# Altium footprint library ICs.PcbLib: 179 footprints (part 6 of 12)
Each footprint in its own frame and in the unit in brackets; x right, y up, seen from the top. Pads: shape width x height; smd on the part's side, far side on the other; paste and mask are expansions set on the pad; w line width, h text height; cw(c..) or ccw(c..) is an arc to the next point about the centre after c.
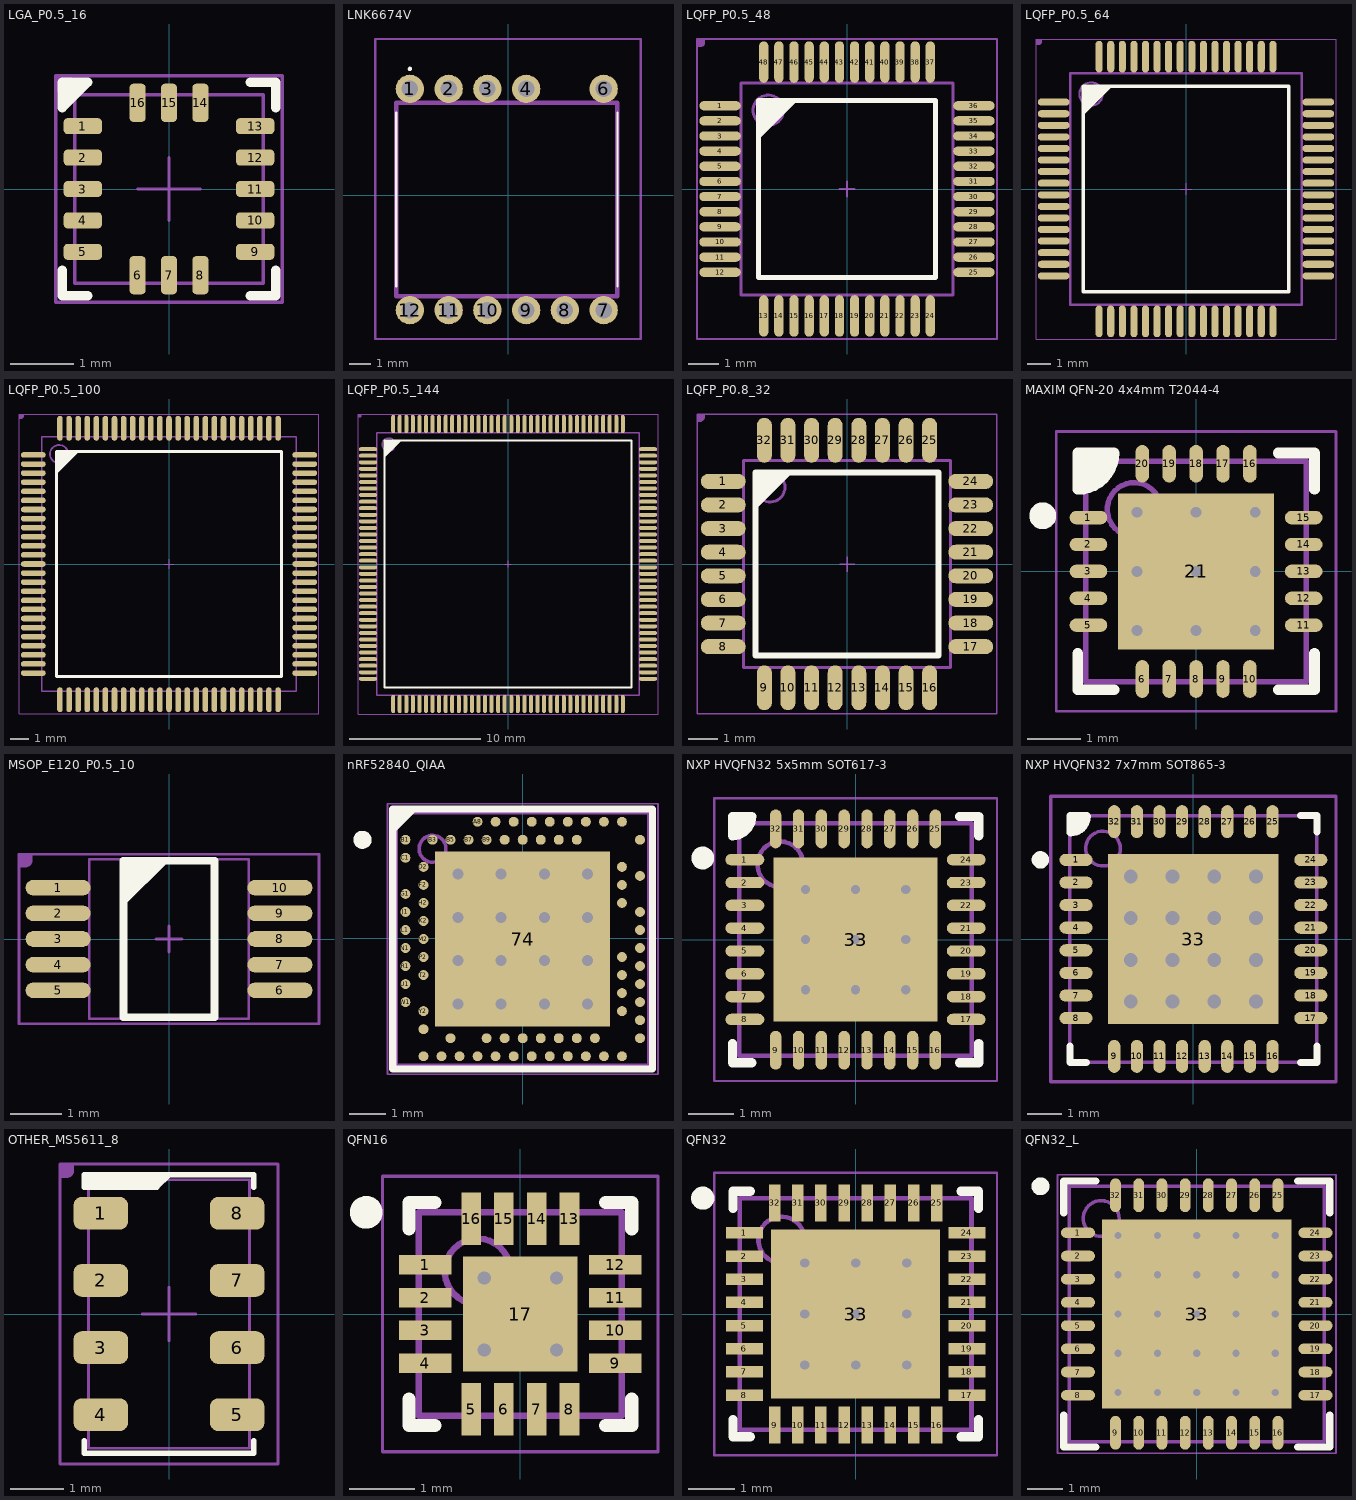
[diagram p5: the footprints below, top view; thin cyan lines are the x and y axes]

## LGA_P0.5_16 [mil]
height 29.53
pads (16):
  rrect50% 24x10 smd: 1(-54,39.37) 2(-54,19.68) 3(-54,0) 4(-54,-19.68) 5(-54,-39.37) 9(54,-39.37) 10(54,-19.68) 11(54,0) 12(54,19.68) 13(54,39.37)
  rrect50% 10x24 smd: 6(-19.68,-54) 7(0,-54) 8(19.68,-54) 14(19.68,54) 15(0,54) 16(-19.68,54)
Top Overlay:
  region: -67,67 -51,67 -67,51
  lines w6: -67,-51 -67,-67 -51,-67 ; 51,-67 67,-67 67,-51 ; 51,67 67,67 67,51 ; -67,51 -67,67 -51,67 -67,51
Top Solder:
  region: 20,-41 -20,-41 -20,-67 20,-67
  region: -41,-40 -41,40 -67,40 -67,-40
  region: 41,40 41,-40 67,-40 67,40
  rectangle: -20,41 20,67
Mechanical 13:
  lines w2: -19.68,0 19.68,0 ; 0,-19.68 0,19.68 ; -59.06,-59.06 59.06,-59.06 59.06,59.06 -59.06,59.06 -59.06,-59.06
Mechanical 14:
  region: -71,71 -61,71 -61,66 -61,65.01 -61.76,63.17 -63.17,61.76 -65.01,61 -66,61 -71,61
  lines w2: -71,-71 71,-71 71,71 -71,71 -71,-71
  text ".Designator" at -41,-25 h100
3D body "PQFN50P300X300X75-16L.step": height 29.53, standoff 0, extent -59.06,-59.06 59.06,59.06

## LNK6674V [mil]
pads (11):
  round 51.29 hole 29.92: 1(-177.39,192) 2(-107.31,192) 3(-37.24,192) 4(32.84,192) 6(173,192) 7(173,-208) 8(102.92,-208) 9(32.84,-208) 10(-37.24,-208) 11(-107.31,-208) 12(-177.39,-208)
Top Overlay:
  lines w3.94: -202.2,-165.48 -202.2,149.48 ; 197.8,-165.48 197.8,149.48 ; -179.36,228.22 cw(c-177.39,228.22) -175.43,228.22 cw(c-177.39,228.22) -179.36,228.22
Mechanical 15:
  lines w7.87: -202.2,-183 197.8,-183 197.8,167 -202.2,167 -202.2,-183
Mechanical 20:
  lines w3.94: -240.2,-260.3 240.2,-260.3 240.2,282.3 -240.2,282.3 -240.2,-260.3

## LQFP_P0.5_48 [mil]
height 62.99
pads (48):
  oval 54x12 smd: 1(-165,108.27) 2(-165,88.58) 3(-165,68.9) 4(-165,49.21) 5(-165,29.53) 6(-165,9.84) 7(-165,-9.84) 8(-165,-29.53) 9(-165,-49.21) 10(-165,-68.9) 11(-165,-88.58) 12(-165,-108.27) 25(165,-108.27) 26(165,-88.58) 27(165,-68.9) 28(165,-49.21) 29(165,-29.53) 30(165,-9.84) 31(165,9.84) 32(165,29.53) 33(165,49.21) 34(165,68.9) 35(165,88.58) 36(165,108.27)
  oval 12x54 smd: 13(-108.27,-165) 14(-88.58,-165) 15(-68.9,-165) 16(-49.21,-165) 17(-29.53,-165) 18(-9.84,-165) 19(9.84,-165) 20(29.53,-165) 21(49.21,-165) 22(68.9,-165) 23(88.58,-165) 24(108.27,-165) 37(108.27,165) 38(88.58,165) 39(68.9,165) 40(49.21,165) 41(29.53,165) 42(9.84,165) 43(-9.84,165) 44(-29.53,165) 45(-49.21,165) 46(-68.9,165) 47(-88.58,165) 48(-108.27,165)
Top Overlay:
  region: -115,115 -65,115 -115,65
  lines w6: -115,-115 -115,115 115,115 115,-115 -115,-115
Mechanical 13:
  circle w3.94: c-102.36,102.36 r19.68
  lines w2: -10,0 10,0 ; 0,-10 0,10
  lines w3.94: -137.8,-137.8 -137.8,137.8 137.8,137.8 137.8,-137.8 -137.8,-137.8
Mechanical 14:
  region: -195,195 -185,195 -185,190 -185,189.01 -185.76,187.17 -187.17,185.76 -189.01,185 -190,185 -195,185
  lines w2: -195,-195 195,-195 195,195 -195,195 -195,-195
  text ".Designator" at -41,-25 h100
3D body "SW3dPS-Quad50M48.STEP": height 61.42, standoff 0, extent -177.16,-177.66 177.17,176.67

## LQFP_P0.5_64 [mil]
height 47.24
pads (64):
  oval 54x12 smd: 1(-225,147.64) 2(-225,127.95) 3(-225,108.27) 4(-225,88.58) 5(-225,68.9) 6(-225,49.21) 7(-225,29.53) 8(-225,9.84) 9(-225,-9.84) 10(-225,-29.53) 11(-225,-49.21) 12(-225,-68.9) 13(-225,-88.58) 14(-225,-108.27) 15(-225,-127.95) 16(-225,-147.64) 33(225,-147.64) 34(225,-127.95) 35(225,-108.27) 36(225,-88.58) 37(225,-68.9) 38(225,-49.21) 39(225,-29.53) 40(225,-9.84) 41(225,9.84) 42(225,29.53) 43(225,49.21) 44(225,68.9) 45(225,88.58) 46(225,108.27) 47(225,127.95) 48(225,147.64)
  oval 12x54 smd: 17(-147.64,-225) 18(-127.95,-225) 19(-108.27,-225) 20(-88.58,-225) 21(-68.9,-225) 22(-49.21,-225) 23(-29.53,-225) 24(-9.84,-225) 25(9.84,-225) 26(29.53,-225) 27(49.21,-225) 28(68.9,-225) 29(88.58,-225) 30(108.27,-225) 31(127.95,-225) 32(147.64,-225) 49(147.64,225) 50(127.95,225) 51(108.27,225) 52(88.58,225) 53(68.9,225) 54(49.21,225) 55(29.53,225) 56(9.84,225) 57(-9.84,225) 58(-29.53,225) 59(-49.21,225) 60(-68.9,225) 61(-88.58,225) 62(-108.27,225) 63(-127.95,225) 64(-147.64,225)
Top Overlay:
  region: -175,175 -125,175 -175,125
  lines w6: -175,-175 175,-175 175,175 -175,175 -175,-175
Mechanical 13:
  circle w3.94: c-161.42,161.42 r19.68
  lines w2: -10,0 10,0 ; 0,-10 0,10
  lines w3.94: -196.85,-196.85 -196.85,196.85 196.85,196.85 196.85,-196.85 -196.85,-196.85
Mechanical 14:
  region: -255,255 -245,255 -245,250 -245,249.01 -245.76,247.17 -247.17,245.76 -249.01,245 -250,245 -255,245
  lines w2: -255,-255 -255,255 255,255 255,-255 -255,-255
  text ".Designator" at -41,-25 h100
3D body "User Library-lqpf64.STEP": height 59.06, standoff 0.79, extent -236.21,-236.22 236.23,236.22

## LQFP_P0.5_100 [mil]
height 62.99
pads (100):
  oval 54x12 smd: 1(-294,236.22) 2(-294,216.54) 3(-294,196.85) 4(-294,177.17) 5(-294,157.48) 6(-294,137.8) 7(-294,118.11) 8(-294,98.43) 9(-294,78.74) 10(-294,59.06) 11(-294,39.37) 12(-294,19.68) 13(-294,0) 14(-294,-19.69) 15(-294,-39.37) 16(-294,-59.06) 17(-294,-78.74) 18(-294,-98.43) 19(-294,-118.11) 20(-294,-137.8) 21(-294,-157.48) 22(-294,-177.17) 23(-294,-196.85) 24(-294,-216.54) 25(-294,-236.22) 51(294,-236.22) 52(294,-216.54) 53(294,-196.85) 54(294,-177.17) 55(294,-157.48) 56(294,-137.8) 57(294,-118.11) 58(294,-98.43) 59(294,-78.74) 60(294,-59.06) 61(294,-39.37) 62(294,-19.69) 63(294,0) 64(294,19.68) 65(294,39.37) 66(294,59.06) 67(294,78.74) 68(294,98.43) 69(294,118.11) 70(294,137.8) 71(294,157.48) 72(294,177.17) 73(294,196.85) 74(294,216.54) 75(294,236.22)
  oval 12x54 smd: 26(-236.22,-294) 27(-216.54,-294) 28(-196.85,-294) 29(-177.17,-294) 30(-157.48,-294) 31(-137.8,-294) 32(-118.11,-294) 33(-98.43,-294) 34(-78.74,-294) 35(-59.06,-294) 36(-39.37,-294) 37(-19.68,-294) 38(0,-294) 39(19.69,-294) 40(39.37,-294) 41(59.06,-294) 42(78.74,-294) 43(98.43,-294) 44(118.11,-294) 45(137.8,-294) 46(157.48,-294) 47(177.17,-294) 48(196.85,-294) 49(216.54,-294) 50(236.22,-294) 76(236.22,294) 77(216.54,294) 78(196.85,294) 79(177.17,294) 80(157.48,294) 81(137.8,294) 82(118.11,294) 83(98.43,294) 84(78.74,294) 85(59.06,294) 86(39.37,294) 87(19.69,294) 88(0,294) 89(-19.68,294) 90(-39.37,294) 91(-59.06,294) 92(-78.74,294) 93(-98.43,294) 94(-118.11,294) 95(-137.8,294) 96(-157.48,294) 97(-177.17,294) 98(-196.85,294) 99(-216.54,294) 100(-236.22,294)
Top Overlay:
  region: -244,244 -194,244 -244,194
  lines w6: -244,-244 244,-244 244,244 -244,244 -244,-244
Mechanical 13:
  circle w3.94: c-238.19,238.19 r19.68
  lines w2: -10,0 10,0 ; 0,-10 0,10
  lines w3.94: -275.59,-275.59 -275.59,275.59 275.59,275.59 275.59,-275.59 -275.59,-275.59
Mechanical 14:
  region: -325,325 -315,325 -315,320 -315,319.01 -315.76,317.17 -317.17,315.76 -319.01,315 -320,315 -325,315
  lines w2: -325,-325 325,-325 325,325 -325,325 -325,-325
  text ".Designator" at -41,-25 h100
3D body "User Library-LQFP100-0_5.STEP": height 61.5, standoff -0.39, extent -310.47,-310.47 310.49,310.48

## LQFP_P0.5_144 [mil]
height 62.99
pads (144):
  oval 54x12 smd: 1(-420,344.49) 2(-420,324.8) 3(-420,305.12) 4(-420,285.43) 5(-420,265.75) 6(-420,246.06) 7(-420,226.38) 8(-420,206.69) 9(-420,187.01) 10(-420,167.32) 11(-420,147.64) 12(-420,127.95) 13(-420,108.27) 14(-420,88.58) 15(-420,68.9) 16(-420,49.21) 17(-420,29.53) 18(-420,9.84) 19(-420,-9.84) 20(-420,-29.53) 21(-420,-49.21) 22(-420,-68.9) 23(-420,-88.58) 24(-420,-108.27) 25(-420,-127.95) 26(-420,-147.64) 27(-420,-167.32) 28(-420,-187.01) 29(-420,-206.69) 30(-420,-226.38) 31(-420,-246.06) 32(-420,-265.75) 33(-420,-285.43) 34(-420,-305.12) 35(-420,-324.8) 36(-420,-344.49) 73(420,-344.49) 74(420,-324.8) 75(420,-305.12) 76(420,-285.43) 77(420,-265.75) 78(420,-246.06) 79(420,-226.38) 80(420,-206.69) 81(420,-187.01) 82(420,-167.32) 83(420,-147.64) 84(420,-127.95) 85(420,-108.27) 86(420,-88.58) 87(420,-68.9) 88(420,-49.21) 89(420,-29.53) 90(420,-9.84) 91(420,9.84) 92(420,29.53) 93(420,49.21) 94(420,68.9) 95(420,88.58) 96(420,108.27) 97(420,127.95) 98(420,147.64) 99(420,167.32) 100(420,187.01) 101(420,206.69) 102(420,226.38) 103(420,246.06) 104(420,265.75) 105(420,285.43) 106(420,305.12) 107(420,324.8) 108(420,344.49)
  oval 12x54 smd: 37(-344.49,-420) 38(-324.8,-420) 39(-305.12,-420) 40(-285.43,-420) 41(-265.75,-420) 42(-246.06,-420) 43(-226.38,-420) 44(-206.69,-420) 45(-187.01,-420) 46(-167.32,-420) 47(-147.64,-420) 48(-127.95,-420) 49(-108.27,-420) 50(-88.58,-420) 51(-68.9,-420) 52(-49.21,-420) 53(-29.53,-420) 54(-9.84,-420) 55(9.84,-420) 56(29.53,-420) 57(49.21,-420) 58(68.9,-420) 59(88.58,-420) 60(108.27,-420) 61(127.95,-420) 62(147.64,-420) 63(167.32,-420) 64(187.01,-420) 65(206.69,-420) 66(226.38,-420) 67(246.06,-420) 68(265.75,-420) 69(285.43,-420) 70(305.12,-420) 71(324.8,-420) 72(344.49,-420) 109(344.49,420) 110(324.8,420) 111(305.12,420) 112(285.43,420) 113(265.75,420) 114(246.06,420) 115(226.38,420) 116(206.69,420) 117(187.01,420) 118(167.32,420) 119(147.64,420) 120(127.95,420) 121(108.27,420) 122(88.58,420) 123(68.9,420) 124(49.21,420) 125(29.53,420) 126(9.84,420) 127(-9.84,420) 128(-29.53,420) 129(-49.21,420) 130(-68.9,420) 131(-88.58,420) 132(-108.27,420) 133(-127.95,420) 134(-147.64,420) 135(-167.32,420) 136(-187.01,420) 137(-206.69,420) 138(-226.38,420) 139(-246.06,420) 140(-265.75,420) 141(-285.43,420) 142(-305.12,420) 143(-324.8,420) 144(-344.49,420)
Top Overlay:
  region: -370,370 -320,370 -370,320
  lines w6: -370,-370 370,-370 370,370 -370,370 -370,-370
Mechanical 13:
  circle w4: c-358.27,358.27 r19.68
  lines w2: -10,0 10,0 ; 0,-10 0,10
  lines w4: -393.7,-393.7 393.7,-393.7 393.7,393.7 -393.7,393.7 -393.7,-393.7
Mechanical 14:
  region: -450,450 -440,450 -440,445 -440,444.01 -440.76,442.17 -442.17,440.76 -444.01,440 -445,440 -450,440
  lines w2: -450,-450 -450,450 450,450 450,-450 -450,-450
  text ".Designator" at -41,-25 h100
3D body "User Library-LQFP144.STEP": height 62.99, standoff 0, extent -433.07,-433.07 433.08,433.08

## LQFP_P0.8_32 [mil]
height 47.24
pads (32):
  oval 60x20 smd: 1(-165,110.24) 2(-165,78.74) 3(-165,47.24) 4(-165,15.75) 5(-165,-15.75) 6(-165,-47.24) 7(-165,-78.74) 8(-165,-110.24) 17(165,-110.24) 18(165,-78.74) 19(165,-47.24) 20(165,-15.75) 21(165,15.75) 22(165,47.24) 23(165,78.74) 24(165,110.24)
  oval 20x60 smd: 9(-110.24,-165) 10(-78.74,-165) 11(-47.24,-165) 12(-15.75,-165) 13(15.75,-165) 14(47.24,-165) 15(78.74,-165) 16(110.24,-165) 25(110.24,165) 26(78.74,165) 27(47.24,165) 28(15.75,165) 29(-15.75,165) 30(-47.24,165) 31(-78.74,165) 32(-110.24,165)
Top Overlay:
  region: -122.05,122.05 -72.05,122.05 -122.05,72.05
  lines w7.87: -122.05,-122.05 -122.05,122.05 122.05,122.05 122.05,-122.05 -122.05,-122.05
Mechanical 13:
  circle w3.94: c-102.36,102.36 r19.68
  lines w2: -10,0 10,0 ; 0,-10 0,10
  lines w3.94: -137.8,-137.8 -137.8,137.8 137.8,137.8 137.8,-137.8 -137.8,-137.8
Mechanical 14:
  region: -200,200 -190,200 -190,195 -190,194.01 -190.76,192.17 -192.17,190.76 -194.01,190 -195,190 -200,190
  lines w2: -200,-200 200,-200 200,200 -200,200 -200,-200
  text ".Designator" at -41,-25 h100
3D body "User Library-LQFP32-0_8.STEP": height 63.46, standoff -2.02, extent -177.92,-177.92 177.93,177.93

## MAXIM QFN-20 4x4mm T2044-4 [mm] "TQFN, 20-Leads, Body 4.00x4.00mm, Pitch 0.50mm, Thermal Pad 2.90x2.90mm, IPC Medium Density"
height 0.8
pads (21):
  oval 0.7x0.25 smd: 1(-2,1) 2(-2,0.5) 3(-2,0) 4(-2,-0.5) 5(-2,-1) 11(2,-1) 12(2,-0.5) 13(2,0) 14(2,0.5) 15(2,1)
  oval 0.25x0.7 smd: 6(-1,-2) 7(-0.5,-2) 8(0,-2) 9(0.5,-2) 10(1,-2) 16(1,2) 17(0.5,2) 18(0,2) 19(-0.5,2) 20(-1,2)
  rect 2.9x2.9 smd: 21(0,0)
via 1.1,-1.1 diameter 0.5 hole 0.2
via 0,-1.1 diameter 0.5 hole 0.2
via -1.1,-1.1 diameter 0.5 hole 0.2
via 1.1,0 diameter 0.5 hole 0.2
via 0,0 diameter 0.5 hole 0.2
via -1.1,0 diameter 0.5 hole 0.2
via 1.1,1.1 diameter 0.5 hole 0.2
via 0,1.1 diameter 0.5 hole 0.2
via -1.1,1.1 diameter 0.5 hole 0.2
Top Overlay:
  circle w0.25: c-2.85,1.034 r0.125
  region: -2.159,2.2 -1.525,2.2 -1.525,1.904 -1.904,1.525 -2.2,1.525
  lines w0.2: -2.2,-1.525 -2.2,-2.2 -1.525,-2.2 ; 1.525,-2.2 2.2,-2.2 2.2,-1.525 ; 1.525,2.2 2.2,2.2 2.2,1.525 ; -2.2,1.525 ccw(c-2.2,2.2) -1.525,2.2 -2.2,2.2 -2.2,1.525
Mechanical 13:
  circle w0.1: c-1.15,1.15 r0.5
  lines w0.1: -2.05,-2.05 2.05,-2.05 2.05,2.05 -2.05,2.05 -2.05,-2.05
Mechanical 15:
  lines w0.05: -2.6,-2.6 2.6,-2.6 2.6,2.6 -2.6,2.6 -2.6,-2.6
  lines w0.1: -0.5,0 0.5,0 ; 0,-0.5 0,0.5
3D body: height 0.8, standoff 0.01, extent -2.05,-2.05 2.05,2.05

## MSOP_E120_P0.5_10 [mil]
height 43.31
pads (10):
  oval 50x12 smd: 1(-85,39.37) 2(-85,19.69) 3(-85,0) 4(-85,-19.68) 5(-85,-39.37) 6(85,-39.37) 7(85,-19.68) 8(85,0) 9(85,19.69) 10(85,39.37)
Top Overlay:
  region: -35,60 0,60 -35,25
  lines w6: -35,-60 -35,60 35,60 35,-60 -35,-60
Mechanical 13:
  lines w2: -10,0 10,0 ; 0,-10 0,10 ; -61.02,-61.02 61.02,-61.02 61.02,61.02 -61.02,61.02 -61.02,-61.02
Mechanical 14:
  region: -115,65 -105,65 -105,60 -105,59.01 -105.76,57.17 -107.17,55.76 -109.01,55 -110,55 -115,55
  lines w2: -115,-65 115,-65 115,65 -115,65 -115,-65
  text ".Designator" at -41,-25 h100
3D body "User Library-msop-10.STEP": height 45.28, standoff 0, extent -96.45,-59.05 96.46,59.06

## nRF52840_QIAA [mm]
pads (74):
  rect 4.85x4.85 smd mask+0.05: 74(-0.007,-0.024)
  round 0.275 smd paste+0.012 mask+0.05: A8(-1.257,3.226) A10(-0.757,3.226) A12(-0.257,3.226) A14(0.243,3.226) A16(0.743,3.226) A18(1.243,3.226) A20(1.743,3.226) A22(2.243,3.226) A23(2.743,3.226) AA24(3.243,-2.274) AB2(-2.757,-2.524) AC5(-2.007,-2.774) AC9(-1.007,-2.774) AC11(-0.507,-2.774) AC13(-0.007,-2.774) AC15(0.493,-2.774) AC17(0.993,-2.774) AC19(1.493,-2.774) AC21(1.993,-2.774) AC24(3.243,-2.774) AD2(-2.757,-3.274) AD4(-2.257,-3.274) AD6(-1.757,-3.274) AD8(-1.257,-3.274) AD10(-0.757,-3.274) AD12(-0.257,-3.274) AD14(0.243,-3.274) AD16(0.743,-3.274) AD18(1.243,-3.274) AD20(1.743,-3.274) AD22(2.243,-3.274) AD23(2.743,-3.274) B1(-3.257,2.726) B3(-2.507,2.726) B5(-2.007,2.726) B7(-1.507,2.726) B9(-1.007,2.726) B11(-0.507,2.726) B13(-0.007,2.726) B15(0.493,2.726) B17(0.993,2.726) B19(1.493,2.726) B24(3.243,2.726) C1(-3.257,2.226) D2(-2.757,1.976) D23(2.743,1.976) E24(3.243,1.726) F2(-2.757,1.476) F23(2.743,1.476) G1(-3.257,1.226) H2(-2.757,0.976) H23(2.743,0.976) J1(-3.257,0.726) J24(3.243,0.726) K2(-2.757,0.476) L1(-3.257,0.226) L24(3.243,0.226) M2(-2.757,-0.024) N1(-3.257,-0.274) N24(3.243,-0.274) P2(-2.757,-0.524) P23(2.743,-0.524) R1(-3.257,-0.774) R24(3.243,-0.774) T2(-2.757,-1.024) T23(2.743,-1.024) U1(-3.257,-1.274) U24(3.243,-1.274) V23(2.743,-1.524) W1(-3.257,-1.774) W24(3.243,-1.774) Y2(-2.757,-2.024) Y23(2.743,-2.024)
via 1.793,-1.824 diameter 0.61 hole 0.305
via 0.593,-1.824 diameter 0.61 hole 0.305
via -0.607,-1.824 diameter 0.61 hole 0.305
via -1.807,-1.824 diameter 0.61 hole 0.305
via 1.793,-0.624 diameter 0.61 hole 0.305
via 0.593,-0.624 diameter 0.61 hole 0.305
via -0.607,-0.624 diameter 0.61 hole 0.305
via -1.807,-0.624 diameter 0.61 hole 0.305
via 1.793,0.576 diameter 0.61 hole 0.305
via 0.593,0.576 diameter 0.61 hole 0.305
via -0.607,0.576 diameter 0.61 hole 0.305
via -1.807,0.576 diameter 0.61 hole 0.305
via 1.793,1.776 diameter 0.61 hole 0.305
via 0.593,1.776 diameter 0.61 hole 0.305
via -0.607,1.776 diameter 0.61 hole 0.305
via -1.807,1.776 diameter 0.61 hole 0.305
Top Overlay:
  circle w0.25: c-4.447,2.726 r0.125
  region: -3.007,3.476 -3.507,2.976 -3.507,3.476
  lines w0.2: -3.607,-3.624 3.593,-3.624 3.593,3.576 -3.607,3.576 -3.607,-3.624
Mechanical 7:
  circle w0.1: c-2.507,2.476 r0.373
  lines w0.1: -3.507,-3.524 -3.507,3.476 3.493,3.476 3.493,-3.524 -3.507,-3.524
  text ".Designator" at -0.185,-0.177 h0.3
Mechanical 15:
  lines w0.05: -3.757,-3.774 3.743,-3.774 3.743,3.726 -3.757,3.726 -3.757,-3.774
  lines w0.1: -0.507,-0.024 0.493,-0.024 ; -0.007,-0.524 -0.007,0.476
3D body "LGA88C25P25X25_700X700X85.step": height 0.85, standoff 0, extent -3.557,-3.574 3.543,3.526

## NXP HVQFN32 5x5mm SOT617-3 [mm] "HVQFN, 32-Leads, Body 5.00x5.00mm, Pitch 0.50mm, Thermal Pad 3.60x3.60mm, IPC Medium Density"
height 0.85
pads (33):
  oval 0.85x0.25 smd: 1(-2.425,1.75) 2(-2.425,1.25) 3(-2.425,0.75) 4(-2.425,0.25) 5(-2.425,-0.25) 6(-2.425,-0.75) 7(-2.425,-1.25) 8(-2.425,-1.75) 17(2.425,-1.75) 18(2.425,-1.25) 19(2.425,-0.75) 20(2.425,-0.25) 21(2.425,0.25) 22(2.425,0.75) 23(2.425,1.25) 24(2.425,1.75)
  oval 0.25x0.85 smd: 9(-1.75,-2.425) 10(-1.25,-2.425) 11(-0.75,-2.425) 12(-0.25,-2.425) 13(0.25,-2.425) 14(0.75,-2.425) 15(1.25,-2.425) 16(1.75,-2.425) 25(1.75,2.425) 26(1.25,2.425) 27(0.75,2.425) 28(0.25,2.425) 29(-0.25,2.425) 30(-0.75,2.425) 31(-1.25,2.425) 32(-1.75,2.425)
  rect 3.6x3.6 smd: 33(0,0)
via 1.1,-1.1 diameter 0.5 hole 0.2
via 0,-1.1 diameter 0.5 hole 0.2
via -1.1,-1.1 diameter 0.5 hole 0.2
via 1.1,0 diameter 0.5 hole 0.2
via 0,0 diameter 0.5 hole 0.2
via -1.1,0 diameter 0.5 hole 0.2
via 1.1,1.1 diameter 0.5 hole 0.2
via 0,1.1 diameter 0.5 hole 0.2
via -1.1,1.1 diameter 0.5 hole 0.2
Top Overlay:
  circle w0.25: c-3.35,1.788 r0.125
  region: -2.7,2.7 -2.275,2.7 -2.275,2.551 -2.551,2.275 -2.7,2.275
  lines w0.2: -2.7,-2.275 -2.7,-2.7 -2.275,-2.7 ; 2.275,-2.7 2.7,-2.7 2.7,-2.275 ; 2.275,2.7 2.7,2.7 2.7,2.275 ; -2.7,2.275 ccw(c-2.7,2.7) -2.275,2.7 -2.7,2.7 -2.7,2.275
Mechanical 13:
  circle w0.1: c-1.65,1.65 r0.5
  lines w0.1: -2.55,-2.55 2.55,-2.55 2.55,2.55 -2.55,2.55 -2.55,-2.55
Mechanical 15:
  lines w0.05: -3.1,-3.1 3.1,-3.1 3.1,3.1 -3.1,3.1 -3.1,-3.1
  lines w0.1: -0.5,0 0.5,0 ; 0,-0.5 0,0.5
3D body: height 0.85, standoff 0, extent -2.55,-2.55 2.55,2.55

## NXP HVQFN32 7x7mm SOT865-3 [mm] "QFN, 32-Leads, Body 7.1x7.1mm (max), Pitch 0.65mm, IPC Medium Density"
height 1
pads (33):
  oval 0.95x0.35 smd: 1(-3.375,2.275) 2(-3.375,1.625) 3(-3.375,0.975) 4(-3.375,0.325) 5(-3.375,-0.325) 6(-3.375,-0.975) 7(-3.375,-1.625) 8(-3.375,-2.275) 17(3.375,-2.275) 18(3.375,-1.625) 19(3.375,-0.975) 20(3.375,-0.325) 21(3.375,0.325) 22(3.375,0.975) 23(3.375,1.625) 24(3.375,2.275)
  oval 0.35x0.95 smd: 9(-2.275,-3.375) 10(-1.625,-3.375) 11(-0.975,-3.375) 12(-0.325,-3.375) 13(0.325,-3.375) 14(0.975,-3.375) 15(1.625,-3.375) 16(2.275,-3.375) 25(2.275,3.375) 26(1.625,3.375) 27(0.975,3.375) 28(0.325,3.375) 29(-0.325,3.375) 30(-0.975,3.375) 31(-1.625,3.375) 32(-2.275,3.375)
  rect 4.9x4.9 smd: 33(0,0)
via 1.8,-1.8 diameter 0.8 hole 0.4
via 0.6,-1.8 diameter 0.8 hole 0.4
via -0.6,-1.8 diameter 0.8 hole 0.4
via -1.8,-1.8 diameter 0.8 hole 0.4
via 1.8,-0.6 diameter 0.8 hole 0.4
via 0.6,-0.6 diameter 0.8 hole 0.4
via -0.6,-0.6 diameter 0.8 hole 0.4
via -1.8,-0.6 diameter 0.8 hole 0.4
via 1.8,0.6 diameter 0.8 hole 0.4
via 0.6,0.6 diameter 0.8 hole 0.4
via -0.6,0.6 diameter 0.8 hole 0.4
via -1.8,0.6 diameter 0.8 hole 0.4
via 1.8,1.8 diameter 0.8 hole 0.4
via 0.6,1.8 diameter 0.8 hole 0.4
via -0.6,1.8 diameter 0.8 hole 0.4
via -1.8,1.8 diameter 0.8 hole 0.4
Top Overlay:
  circle w0.25: c-4.4,2.275 r0.125
  rectangle: -3.302,3.175 -3.175,3.302
  rectangle: -3.302,3.302 -3.048,3.55
  rectangle: -3.55,3.048 -3.302,3.55
  lines w0.2: -3.55,-3.075 -3.55,-3.55 -3.075,-3.55 ; 3.075,-3.55 3.55,-3.55 3.55,-3.075 ; 3.075,3.55 3.55,3.55 3.55,3.075 ; -3.55,3.075 ccw(c-3.525,3.075) -3.525,3.05 ccw(c-3.525,3.525) -3.05,3.525 ccw(c-3.075,3.525) -3.075,3.55 -3.55,3.55 -3.55,3.075
Mechanical 13:
  circle w0.1: c-2.6,2.6 r0.5
  lines w0.1: -3.55,-3.55 3.55,-3.55 3.55,3.55 -3.55,3.55 -3.55,-3.55
Mechanical 15:
  lines w0.1: -0.5,0 0.5,0 ; 0,-0.5 0,0.5 ; -4.1,-4.1 4.1,-4.1 4.1,4.1 -4.1,4.1 -4.1,-4.1
3D body: height 1, standoff 0, extent -3.55,-3.55 3.55,3.55

## OTHER_MS5611_8 [mil]
height 39.37
pads (8):
  rrect50% 40x24 smd: 1(-50,73.82) 2(-50,24.61) 3(-50,-24.61) 4(-50,-73.82) 5(50,-73.82) 6(50,-24.61) 7(50,24.61) 8(50,73.82)
Top Overlay:
  region: -62,102 0,102 -9,93 -62,93
  lines w4: -62,-93 -62,-102 62,-102 62,-93 ; 0,102 -9,93 -62,93 -62,102 62,102 62,93
Mechanical 13:
  lines w2: -19.68,0 19.68,0 ; 0,-19.68 0,19.68 ; -59.06,-98.43 -59.06,98.43 59.06,98.43 59.06,-98.43 -59.06,-98.43
Mechanical 14:
  region: -80,110 -70,110 -70,105 -70,104.01 -70.76,102.17 -72.17,100.76 -74.01,100 -75,100 -80,100
  lines w2: -80,-110 80,-110 80,110 -80,110 -80,-110
  text ".Designator" at -41,-25 h100
3D body "User Library-CRYSTALSMD5X32.STEP": height 39.37, standoff 0, extent -62.99,-98.43 63,98.43

## QFN16 [mm]
height 0.75
pads (17):
  rect 0.8x0.3 smd: 1(-1.45,0.75) 2(-1.45,0.25) 3(-1.45,-0.25) 4(-1.45,-0.75) 9(1.45,-0.75) 10(1.45,-0.25) 11(1.45,0.25) 12(1.45,0.75)
  rect 0.3x0.8 smd: 5(-0.75,-1.45) 6(-0.25,-1.45) 7(0.25,-1.45) 8(0.75,-1.45) 13(0.75,1.45) 14(0.25,1.45) 15(-0.25,1.45) 16(-0.75,1.45)
  rect 1.75x1.75 smd: 17(0,0)
via 0.55,-0.55 diameter 0.5 hole 0.2
via -0.55,-0.55 diameter 0.5 hole 0.2
via 0.55,0.55 diameter 0.5 hole 0.2
via -0.55,0.55 diameter 0.5 hole 0.2
Top Overlay:
  circle w0.25: c-2.35,1.55 r0.125
  lines w0.2: -1.7,-1.3 -1.7,-1.7 -1.3,-1.7 ; -1.7,1.3 -1.7,1.7 -1.3,1.7 ; 1.3,-1.7 1.7,-1.7 1.7,-1.3 ; 1.3,1.7 1.7,1.7 1.7,1.3
Mechanical 13:
  circle w0.1: c-0.65,0.65 r0.5
  lines w0.1: -1.55,-1.55 1.55,-1.55 1.55,1.55 -1.55,1.55 -1.55,-1.55
Mechanical 15:
  lines w0.05: -2.1,-2.1 2.1,-2.1 2.1,2.1 -2.1,2.1 -2.1,-2.1
  lines w0.1: -0.5,0 0.5,0 ; 0,-0.5 0,0.5
3D body "QFN16.step": height 0.75, standoff 0, extent -1.56,-1.56 1.56,1.56

## QFN32 [mm]
height 0.75
pads (33):
  rect 0.8x0.25 smd: 1(-2.4,1.75) 2(-2.4,1.25) 3(-2.4,0.75) 4(-2.4,0.25) 5(-2.4,-0.25) 6(-2.4,-0.75) 7(-2.4,-1.25) 8(-2.4,-1.75) 17(2.4,-1.75) 18(2.4,-1.25) 19(2.4,-0.75) 20(2.4,-0.25) 21(2.4,0.25) 22(2.4,0.75) 23(2.4,1.25) 24(2.4,1.75)
  rect 0.25x0.8 smd: 9(-1.75,-2.4) 10(-1.25,-2.4) 11(-0.75,-2.4) 12(-0.25,-2.4) 13(0.25,-2.4) 14(0.75,-2.4) 15(1.25,-2.4) 16(1.75,-2.4) 25(1.75,2.4) 26(1.25,2.4) 27(0.75,2.4) 28(0.25,2.4) 29(-0.25,2.4) 30(-0.75,2.4) 31(-1.25,2.4) 32(-1.75,2.4)
  rect 3.65x3.65 smd: 33(0,0)
via -1.1,1.1 diameter 0.5 hole 0.2
via 0,1.1 diameter 0.5 hole 0.2
via 1.1,1.1 diameter 0.5 hole 0.2
via -1.1,0 diameter 0.5 hole 0.2
via 0,0 diameter 0.5 hole 0.2
via 1.1,0 diameter 0.5 hole 0.2
via -1.1,-1.1 diameter 0.5 hole 0.2
via 0,-1.1 diameter 0.5 hole 0.2
via 1.1,-1.1 diameter 0.5 hole 0.2
Top Overlay:
  circle w0.25: c-3.3,2.5 r0.125
  lines w0.2: -2.65,-2.275 -2.65,-2.65 -2.275,-2.65 ; -2.65,2.275 -2.65,2.65 -2.275,2.65 ; 2.275,-2.65 2.65,-2.65 2.65,-2.275 ; 2.275,2.65 2.65,2.65 2.65,2.275
Mechanical 13:
  circle w0.1: c-1.6,1.6 r0.5
  lines w0.1: -2.5,-2.5 -2.5,2.5 2.5,2.5 2.5,-2.5 -2.5,-2.5
Mechanical 15:
  lines w0.05: -3.05,-3.05 -3.05,3.05 3.05,3.05 3.05,-3.05 -3.05,-3.05
  lines w0.1: -0.5,0 0.5,0 ; 0,-0.5 0,0.5
3D body "QFN32.step": height 0.75, standoff 0, extent -2.51,-2.51 2.51,2.51

## QFN32_L [mm] "QFN, 32-Leads, Body 7x7mm, Pitch 0.65mm, Thermal Pad 5.3x5.3mm, IPC High Density"
height 1
pads (33):
  oval 0.95x0.3 smd: 1(-3.325,2.275) 2(-3.325,1.625) 3(-3.325,0.975) 4(-3.325,0.325) 5(-3.325,-0.325) 6(-3.325,-0.975) 7(-3.325,-1.625) 8(-3.325,-2.275) 17(3.325,-2.275) 18(3.325,-1.625) 19(3.325,-0.975) 20(3.325,-0.325) 21(3.325,0.325) 22(3.325,0.975) 23(3.325,1.625) 24(3.325,2.275)
  oval 0.3x0.95 smd: 9(-2.275,-3.325) 10(-1.625,-3.325) 11(-0.975,-3.325) 12(-0.325,-3.325) 13(0.325,-3.325) 14(0.975,-3.325) 15(1.625,-3.325) 16(2.275,-3.325) 25(2.275,3.325) 26(1.625,3.325) 27(0.975,3.325) 28(0.325,3.325) 29(-0.325,3.325) 30(-0.975,3.325) 31(-1.625,3.325) 32(-2.275,3.325)
  rect 5.3x5.3 smd: 33(0,0)
via -2.2,2.2 diameter 0.5 hole 0.2
via -1.1,2.2 diameter 0.5 hole 0.2
via 0,2.2 diameter 0.5 hole 0.2
via 1.1,2.2 diameter 0.5 hole 0.2
via 2.2,2.2 diameter 0.5 hole 0.2
via -2.2,1.1 diameter 0.5 hole 0.2
via -1.1,1.1 diameter 0.5 hole 0.2
via 0,1.1 diameter 0.5 hole 0.2
via 1.1,1.1 diameter 0.5 hole 0.2
via 2.2,1.1 diameter 0.5 hole 0.2
via -2.2,0 diameter 0.5 hole 0.2
via -1.1,0 diameter 0.5 hole 0.2
via 0,0 diameter 0.5 hole 0.2
via 1.1,0 diameter 0.5 hole 0.2
via 2.2,0 diameter 0.5 hole 0.2
via -2.2,-1.1 diameter 0.5 hole 0.2
via -1.1,-1.1 diameter 0.5 hole 0.2
via 0,-1.1 diameter 0.5 hole 0.2
via 1.1,-1.1 diameter 0.5 hole 0.2
via 2.2,-1.1 diameter 0.5 hole 0.2
via -2.2,-2.2 diameter 0.5 hole 0.2
via -1.1,-2.2 diameter 0.5 hole 0.2
via 0,-2.2 diameter 0.5 hole 0.2
via 1.1,-2.2 diameter 0.5 hole 0.2
via 2.2,-2.2 diameter 0.5 hole 0.2
Top Overlay:
  circle w0.25: c-4.375,3.575 r0.125
  lines w0.2: -3.725,-2.825 -3.725,-3.725 -2.825,-3.725 ; -3.725,2.825 -3.725,3.725 -2.825,3.725 ; 2.825,-3.725 3.725,-3.725 3.725,-2.825 ; 2.825,3.725 3.725,3.725 3.725,2.825
Mechanical 13:
  circle w0.1: c-2.675,2.675 r0.5
  lines w0.1: -3.575,-3.575 -3.575,3.575 3.575,3.575 3.575,-3.575 -3.575,-3.575
Mechanical 15:
  lines w0.05: -3.9,-3.9 -3.9,3.9 3.9,3.9 3.9,-3.9 -3.9,-3.9
  lines w0.1: -0.5,0 0.5,0 ; 0,-0.5 0,0.5
3D body: height 1, standoff 0, extent -3.575,-3.575 3.575,3.575